# Altium footprint library B105rlc.PcbLib: 103 footprints (part 3 of 7)
Each footprint in its own frame and in the unit in brackets; x right, y up, seen from the top. Pads: shape width x height; smd on the part's side, far side on the other; paste and mask are expansions set on the pad; w line width, h text height; cw(c..) or ccw(c..) is an arc to the next point about the centre after c.
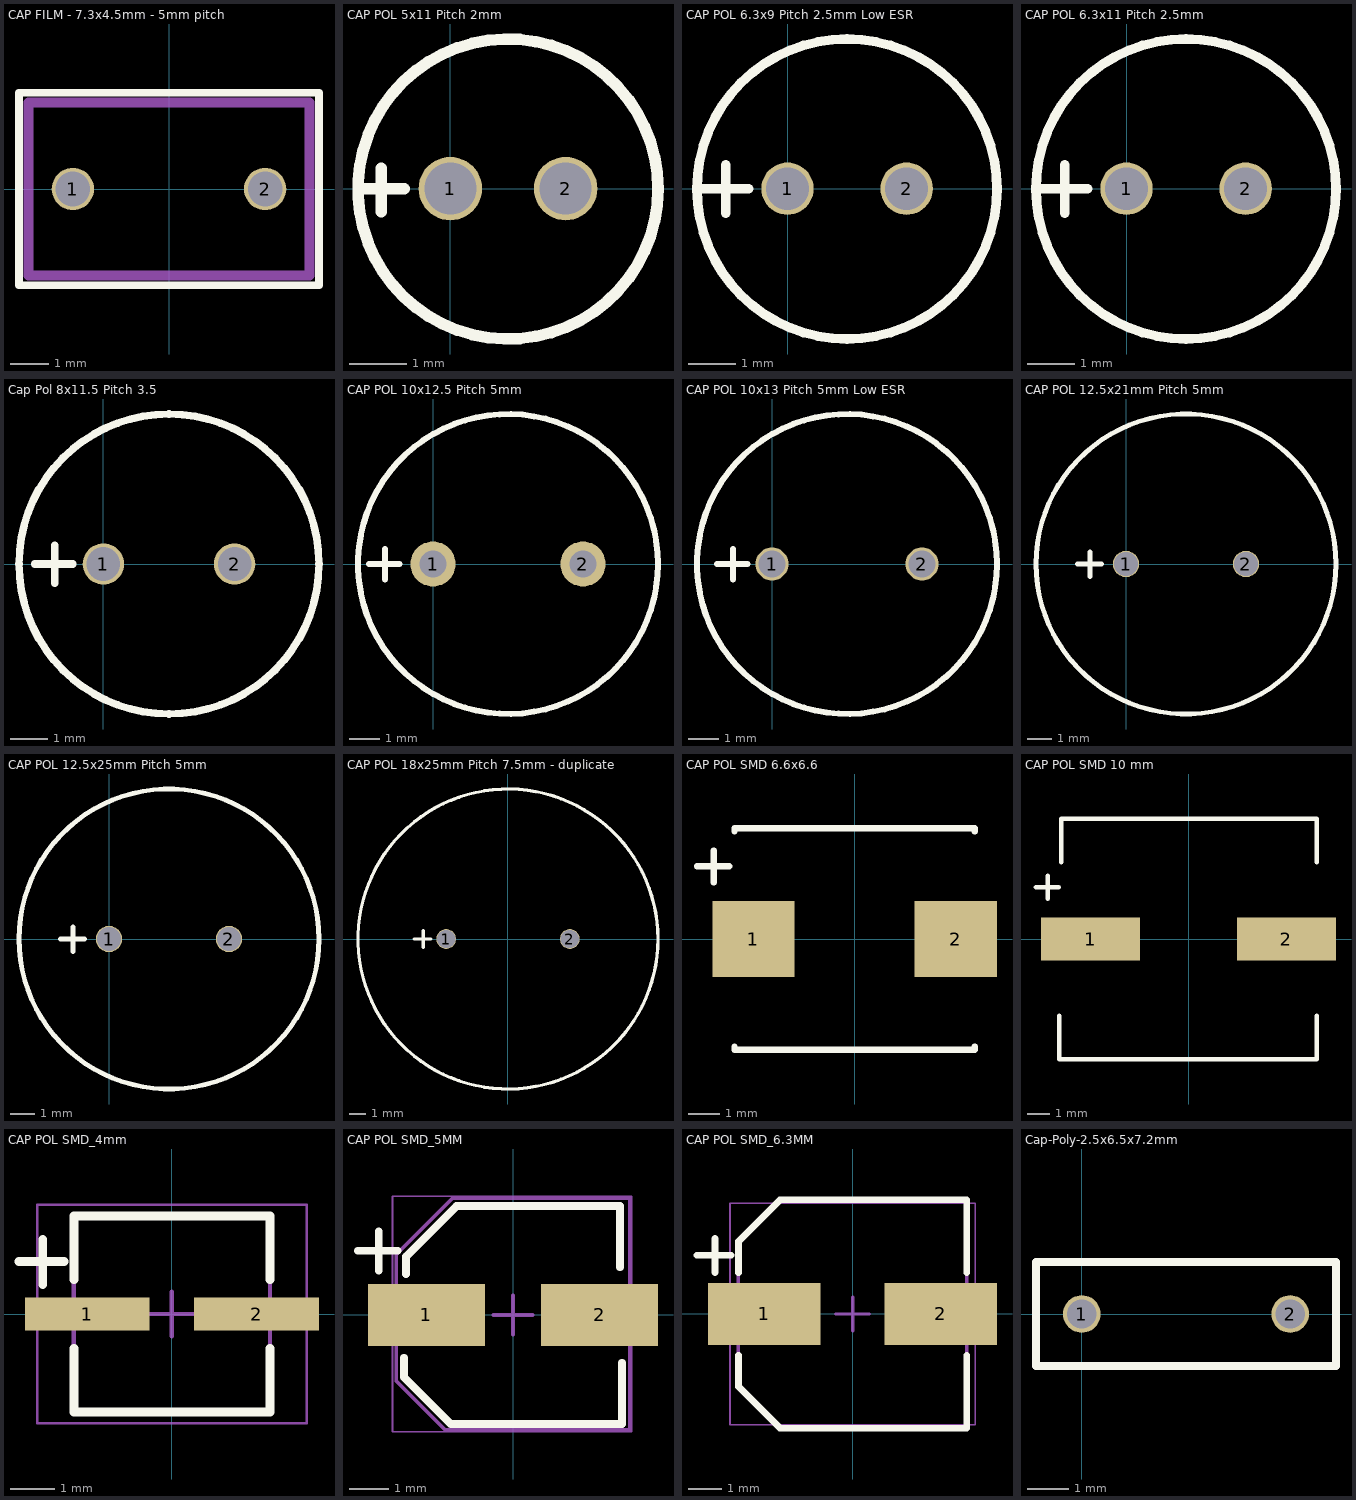
[diagram p2: the footprints below, top view; thin cyan lines are the x and y axes]

## CAP FILM - 7.3x4.5mm - 5mm pitch [mm]
pads (2):
  round 1.1 hole 0.9: 1(-2.5,0) 2(2.5,0)
Top Overlay:
  lines w0.2: -3.9,-2.5 -3.9,2.5 -3.616,2.5 3.9,2.5 3.9,-2.5 -3.9,-2.5
Mechanical 13:
  lines w0.254: -3.65,-2.25 3.65,-2.25 3.65,2.25 -3.65,2.25 -3.65,-2.25
3D body "User Library-filmcap1.step": height 8, standoff -3.17, extent -3.5,-2.275 3.5,2.225

## CAP POL 5x11 Pitch 2mm [mm]
pads (2):
  round 1.1 hole 0.9: 1(0,0) 2(2,0)
Top Overlay:
  circle w0.2: c1,-0.006 r2.6
  lines w0.2: -1.5,0 -0.8,0 ; -1.2,-0.4 -1.2,0.35
3D body "CircuitWorks-ELECTROLITIC CAPACITOR RADIAL 5X11.step": height 11, standoff -2.5, extent -1.5,-2.5 3.5,2.5

## CAP POL 6.3x9 Pitch 2.5mm Low ESR [mm]
pads (2):
  round 1.1 hole 0.9: 1(0,0) 2(2.5,0)
Top Overlay:
  circle w0.2: c1.249,-0.006 r3.15
  lines w0.2: -1.833,0 -0.817,0 ; -1.3,-0.516 -1.3,0.5
3D body "Cap-EL(6_3x11-2_5).step": height 11, standoff -3.2, extent -1.901,-3.15 4.401,3.136

## CAP POL 6.3x11 Pitch 2.5mm [mm]
pads (2):
  round 1.1 hole 0.9: 1(0,0) 2(2.5,0)
Top Overlay:
  circle w0.2: c1.249,-0.006 r3.15
  lines w0.2: -1.833,0 -0.817,0 ; -1.3,-0.516 -1.3,0.5
3D body "Cap-EL(6_3x11-2_5).step": height 11, standoff -3.2, extent -1.901,-3.15 4.401,3.136

## Cap Pol 8x11.5 Pitch 3.5 [mm]
pads (2):
  round 1.1 hole 0.9: 1(0,0) 2(3.5,0)
Top Overlay:
  circle w0.2: c1.75,0 r3.999
  lines w0.2: -1.833,0 -0.817,0 ; -1.3,-0.516 -1.3,0.5
3D body "Cap-EL(8x11_5-3_5).step": height 11.5, standoff -3.3, extent -2.249,-3.982 5.753,4

## CAP POL 10x12.5 Pitch 5mm [mm]
pads (2):
  round 1.5 hole 0.9: 1(0,0) 2(5,0)
Top Overlay:
  circle w0.2: c2.5,0 r5
  lines w0.2: -2.133,0 -1.117,0 ; -1.6,-0.516 -1.6,0.5
3D body "CAP_Electrolytic_10X14_.step": height 14.1, standoff -4.72, extent -2.5,-4.994 7.5,4.994

## CAP POL 10x13 Pitch 5mm Low ESR [mm]
pads (2):
  round 1.1 hole 0.9: 1(0,0) 2(5,0)
Top Overlay:
  circle w0.2: c2.5,0 r5
  lines w0.2: -1.833,0 -0.817,0 ; -1.3,-0.516 -1.3,0.5
3D body "CAP_Electrolytic_10X14_.step": height 14.1, standoff -4.72, extent -2.5,-4.994 7.5,4.994

## CAP POL 12.5x21mm Pitch 5mm [mm]
pads (2):
  round 1.1 hole 1: 1(0,0) 2(5,0)
Top Overlay:
  circle w0.2: c2.5,0 r6.25
  lines w0.2: -2.033,0 -1.017,0 ; -1.5,-0.516 -1.5,0.5
3D body "User Library-CapAluRadial_D125H200.STEP": height 22, standoff -3, extent -4,-6.5 9,6.5

## CAP POL 12.5x25mm Pitch 5mm [mm]
pads (2):
  round 1.1 hole 1: 1(0,0) 2(5,0)
Top Overlay:
  circle w0.2: c2.5,0 r6.25
  lines w0.2: -2.033,0 -1.017,0 ; -1.5,-0.516 -1.5,0.5
3D body "Cap-EL(12_5x25-5).step": height 25, standoff -3.3, extent -3.75,-6.236 8.752,6.236

## CAP POL 18x25mm Pitch 7.5mm - duplicate [mm]
pads (2):
  round 1.2 hole 1.1: 1(-3.75,0) 2(3.75,0)
Top Overlay:
  circle w0.2: c0,0 r9.1
  lines w0.2: -5.683,0 -4.667,0 ; -5.15,-0.516 -5.15,0.5
3D body "User Library-CapAluRadial_D180H250P75.step": height 25, standoff -3, extent -9,-8.999 9.001,8.999

## CAP POL SMD 6.6x6.6 [mm] "Capacitor, SMD Aluminum; Body 6.6 x 6.6 mm (LxW typ)"
height 7.7
pads (2):
  rect 2.6x2.4 smd: 1(-3.2,0) 2(3.2,0)
Top Overlay:
  lines w0.2: -4.983,2.3 -3.967,2.3 ; -4.45,1.784 -4.45,2.8 ; -3.8,-3.5 3.8,-3.5 ; -3.8,-3.45 -3.8,-3.4 ; -3.8,3.4 -3.8,3.45 ; -3.8,3.5 3.8,3.5 ; 3.8,-3.45 3.8,-3.4 ; 3.8,3.4 3.8,3.45
3D body "CAPSMD6_3x3_9.STEP": height 3.91, standoff 0, extent -3.486,-3.3 3.514,3.3

## CAP POL SMD 10 mm [mm] "Capacitor, SMD Aluminum; Body 6.6 x 6.6 mm (LxW typ)"
height 7.7
pads (2):
  rect 4.4x1.9 smd: 1(-4.35,0) 2(4.35,0)
Top Overlay:
  lines w0.2: -6.783,2.3 -5.767,2.3 ; -6.25,1.784 -6.25,2.8 ; -5.75,-3.4 -5.75,-5.35 5.7,-5.35 5.7,-3.4 ; -5.65,3.4 -5.65,5.35 5.7,5.35 5.7,3.4
3D body "User Library-SMD Polymer Aluminum Electrolytic Capacitors F12.step": height 11.1, standoff -0.05, extent -5.5,-5.15 5.5,5.15

## CAP POL SMD_4mm [mm] "SMD POL CAP, 2-Leads, Body 4.30x4.30mm, IPC Medium Density"
height 5
pads (2):
  rect 2.8x0.75 smd: 1(-1.9,0) 2(1.9,0)
Top Overlay:
  lines w0.2: -3.433,1.175 -2.417,1.175 ; -2.9,0.659 -2.9,1.675 ; -2.2,-0.775 -2.2,-2.2 2.2,-2.2 2.2,-0.775 ; -2.2,0.775 -2.2,2.2 2.2,2.2 2.2,0.775
Mechanical 13:
  lines w0.1: -2.2,-2.2 2.2,-2.2 2.2,2.2 -2.2,2.2 -2.2,-2.2
Mechanical 15:
  lines w0.05: -3.025,-2.45 3.025,-2.45 3.025,2.45 -3.025,2.45 -3.025,-2.45
  lines w0.1: -0.5,0 0.5,0 ; 0,-0.5 0,0.5
3D body "User Library-ALU-B.STEP": height 5.4, standoff 0, extent -2.3,-2.15 2.3,2.15

## CAP POL SMD_5MM [mm] "Aluminum Electrolytic Capacitor, Body 6.60x6.60x5.40mm, IPC Low Density"
height 5.4
pads (2):
  rect 3x1.6 smd: 1(-2.225,0) 2(2.225,0)
Top Overlay:
  lines w0.2: -3.983,1.65 -2.967,1.65 ; -3.45,1.134 -3.45,2.15 ; -2.8,-1.1 -2.8,-1.6 -1.6,-2.8 2.8,-2.8 2.8,-1.225 ; -2.75,1.05 -2.75,1.5 -1.45,2.8 2.75,2.8 2.75,1.225
Mechanical 13:
  lines w0.1: -3,-1.7 -1.75,-2.95 3,-2.95 3,3 -1.55,3 -3,1.55 -3,-1.7
Mechanical 15:
  lines w0.05: -3.1,-3 -3.1,3.05 3.05,3.05 3.05,-3 -3.1,-3
  lines w0.1: -0.5,0 0.5,0 ; 0,-0.5 0,0.5
3D body "User Library-ALU-C.STEP": height 5.41, standoff 0, extent -2.95,-2.65 2.95,2.65

## CAP POL SMD_6.3MM [mm] "Aluminum Electrolytic Capacitor, Body 6.60x6.60x5.40mm, IPC Low Density"
height 5.4
pads (2):
  rect 3.35x1.85 smd: 1(-2.625,0) 2(2.625,0)
Top Overlay:
  lines w0.2: -4.633,1.75 -3.617,1.75 ; -4.1,1.234 -4.1,2.25 ; -3.4,-1.225 -3.4,-2.163 -2.163,-3.4 3.4,-3.4 3.4,-1.225 ; -3.4,1.225 -3.4,2.163 -2.163,3.4 3.4,3.4 3.4,1.225
Mechanical 13:
  lines w0.1: -3.4,-2.163 -3.4,2.163 -2.163,3.4 3.4,3.4 3.4,-3.4 -2.163,-3.4 -3.4,-2.163
Mechanical 15:
  lines w0.05: -3.65,-3.3 3.65,-3.3 3.65,3.3 -3.65,3.3 -3.65,-3.3
  lines w0.1: -0.5,0 0.5,0 ; 0,-0.5 0,0.5
3D body "SMD Polymer Aluminum Electrolytic Capacitors C6 100uF 6,3V.step": height 5.9, standoff -0.05, extent -3.65,-3.3 3.65,3.3

## Cap-Poly-2.5x6.5x7.2mm [mm]
pads (2):
  round 0.9 hole 0.7: 1(0,0) 2(5,0)
Top Overlay:
  lines w0.2: -1.1,-1.25 6.1,-1.25 6.1,1.25 -1.1,1.25 -1.1,-1.25
3D body "Cap-5 (7_2x7_5x2_2).step": height 8.53, standoff -3, extent -1.1,-1.1 6.1,1.1